# Altium footprint library 风扇_V1.1.PcbLib: 18 footprints (part 1 of 2)
Each footprint in its own frame and in the unit in brackets; x right, y up, seen from the top. Pads: shape width x height; smd on the part's side, far side on the other; paste and mask are expansions set on the pad; w line width, h text height; cw(c..) or ccw(c..) is an arc to the next point about the centre after c.
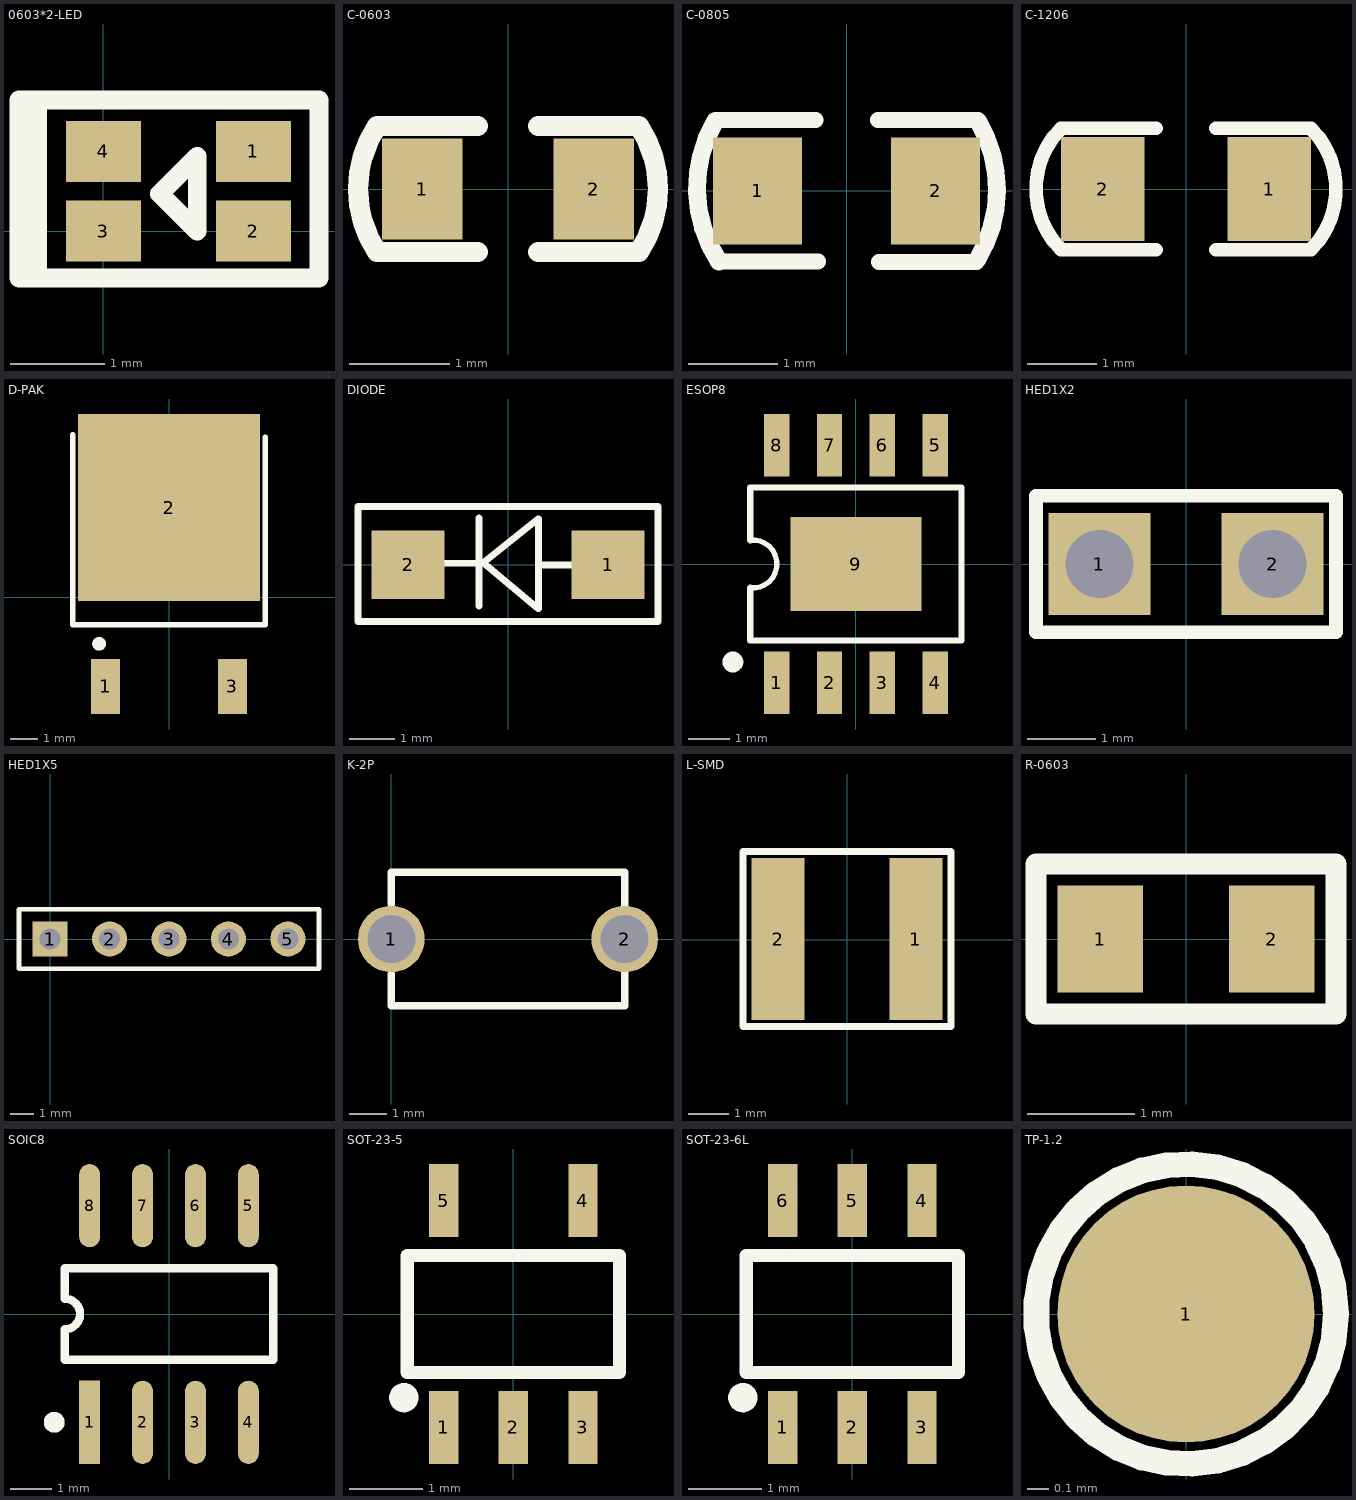
[diagram p0: the footprints below, top view; thin cyan lines are the x and y axes]

## 0603*2-LED [mm]
pads (4):
  rect 0.8x0.65 smd: 1(1.6,0.85) 2(1.6,0) 3(0,0) 4(0,0.85)
Top Overlay:
  lines w0.2: -0.7,-0.5 -0.7,1.4 ; -0.9,-0.5 2.3,-0.5 2.3,1.4 -0.9,1.4 -0.9,-0.5 ; 0.6,0.4 1,0 1,0.8 0.6,0.4

## C-0603 [mm]
pads (2):
  rect 0.8x1 smd: 1(-0.85,0) 2(0.85,0)
Top Overlay:
  lines w0.2: -0.3,-0.628 -1.3,-0.628 cw(c-0.359,0) -1.3,0.628 -0.3,0.628 ; 0.3,-0.628 1.3,-0.628 ccw(c0.359,0) 1.3,0.628 0.3,0.628

## C-0805 [mm]
pads (2):
  rect 1x1.2 smd: 1(-1,0) 2(1,0)
Top Overlay:
  lines w0.18: -1.46,0.797 -0.35,0.797 ; -1.435,-0.791 -0.325,-0.791 ; 0.35,0.797 1.473,0.797 ; 0.363,-0.797 1.46,-0.797
  lines w0.2: -1.475,0.788 ccw(c-0.18,0.029) -1.434,-0.796 ; 1.467,-0.771 ccw(c0.188,0.013) 1.473,0.787

## C-1206 [mm]
pads (2):
  rect 1.2x1.5 smd: 1(1.2,0) 2(-1.2,0)
Top Overlay:
  lines w0.2: -0.434,-0.875 -1.8,-0.875 cw(c-0.925,0) -1.8,0.875 -0.434,0.875 ; 0.434,-0.875 1.8,-0.875 ccw(c0.925,0) 1.8,0.875 0.434,0.875

## D-PAK [mm]
pads (3):
  rect 1.05x2 smd: 1(-2.3,-3.25) 3(2.3,-3.25)
  rect 6.6x6.8 smd: 2(0,3.25)
Top Overlay:
  circle w0.25: c-2.54,-1.7 r0.125
  lines w0.2: -3.5,5.9 -3.5,-1 3.5,-1 3.5,5.8

## DIODE [mm]
pads (2):
  rect 1.6x1.5 smd: 1(2.2,0) 2(-2.2,0)
Top Overlay:
  lines w0.15: -1.41,0.03 -0.64,0.03 ; -0.64,-0.91 -0.64,1.03 ; 0.7,-0.01 1.38,-0.01 ; -3.3,-1.25 3.3,-1.25 3.3,1.28 -3.3,1.28 -3.3,-1.25 ; -0.54,0.04 0.67,1.01 0.67,-0.97 -0.54,0.04

## ESOP8 [mil]
pads (9):
  rect 24x59.06 smd: 1(-75,-112.5) 2(-25,-112.5) 3(25,-112.5) 4(75,-112.5) 5(75,112.5) 6(25,112.5) 7(-25,112.5) 8(-75,112.5)
  rect 124.02x88.98 smd: 9(0,0)
Top Overlay:
  circle w9.84: c-116.54,-92.81 r4.92
  lines w4.92: -100,-22.5 -95,-22.5 ; -100,22.5 -95,22.5
  lines w5: -95,-22.5 ccw(c-97.48,0) -95,22.5
  lines w5.91: -100,-22.5 -100,-72.5 100,-72.5 100,72.5 -100,72.5 -100,22.5

## HED1X2 [mm]
pads (2):
  rect 1.5x1.5 hole 1: 1(-1.27,0) 2(1.27,0)
Top Overlay:
  lines w0.2: -2.2,-1 -2.2,1 2.2,1 2.2,-1 -2.2,-1

## HED1X5 [mm]
pads (5):
  rect 1.5x1.5 hole 0.9: 1(0,0)
  round 1.5 hole 0.9: 2(2.54,0) 3(5.08,0) 4(7.62,0) 5(10.16,0)
Top Overlay:
  lines w0.2: -1.33,-1.27 -1.33,1.27 ; -1.3,-1.27 11.49,-1.27 11.49,1.27 -1.3,1.27

## K-2P [mm]
pads (2):
  round 1.8 hole 1.3 mask+0.102: 1(0,0) 2(6.3,0)
Top Overlay:
  lines w0.2: 0,-0.95 0,-1.8 6.3,-1.8 ; 0,0.95 0,1.8 6.3,1.8 ; 6.3,-1.75 6.3,-0.9 ; 6.3,0.9 6.3,1.75

## L-SMD [mm]
pads (2):
  rect 1.3x4 smd: 1(1.692,0.016) 2(-1.708,0.016)
Top Overlay:
  lines w0.18: -2.572,-2.143 2.556,-2.143 2.556,2.175 -2.572,2.175 -2.572,-2.143

## R-0603 [mm]
pads (2):
  rect 0.8x1 smd: 1(-0.8,0) 2(0.8,0)
Top Overlay:
  lines w0.2: -1.4,-0.7 1.4,-0.7 1.4,0.7 -1.4,0.7 -1.4,-0.7

## SOIC8 [mm]
pads (8):
  rect 0.5x2 smd: 1(-1.905,-2.6)
  oval 0.5x2 smd: 2(-0.635,-2.6) 3(0.635,-2.6) 4(1.905,-2.6) 5(1.905,2.6) 6(0.635,2.6) 7(-0.635,2.6) 8(-1.905,2.6)
Top Overlay:
  circle w0.25: c-2.755,-2.6 r0.125
  lines w0.2: -2.5,-1.1 2.5,-1.1 2.5,1.1 -2.5,1.1 -2.5,0.367 cw(c-2.5,0) -2.5,-0.367 -2.5,-1.1

## SOT-23-5 [mm]
pads (5):
  rect 0.4x1 smd: 1(-0.95,-1.55) 2(0,-1.55) 3(0.95,-1.55) 4(0.95,1.55) 5(-0.95,1.55)
Top Overlay:
  circle w0.2: c-1.497,-1.143 r0.1
  lines w0.18: -1.45,-0.8 -1.45,0.8 1.45,0.8 1.45,-0.8 -1.45,-0.8

## SOT-23-6L [mm]
pads (6):
  rect 0.4x1 smd: 1(-0.95,-1.55) 2(0,-1.55) 3(0.95,-1.55) 4(0.95,1.55) 5(0,1.55) 6(-0.95,1.55)
Top Overlay:
  circle w0.2: c-1.497,-1.143 r0.1
  lines w0.18: -1.45,-0.8 -1.45,0.8 1.45,0.8 1.45,-0.8 -1.45,-0.8

## TP-1.2 [mm]
pads (1):
  round 1.2 smd: 1(0,0)
Top Overlay:
  circle w0.12: c0,0 r0.7